# Altium footprint library PCB24.PcbLib: 86 footprints (part 3 of 6)
Each footprint in its own frame and in the unit in brackets; x right, y up, seen from the top. Pads: shape width x height; smd on the part's side, far side on the other; paste and mask are expansions set on the pad; w line width, h text height; cw(c..) or ccw(c..) is an arc to the next point about the centre after c.
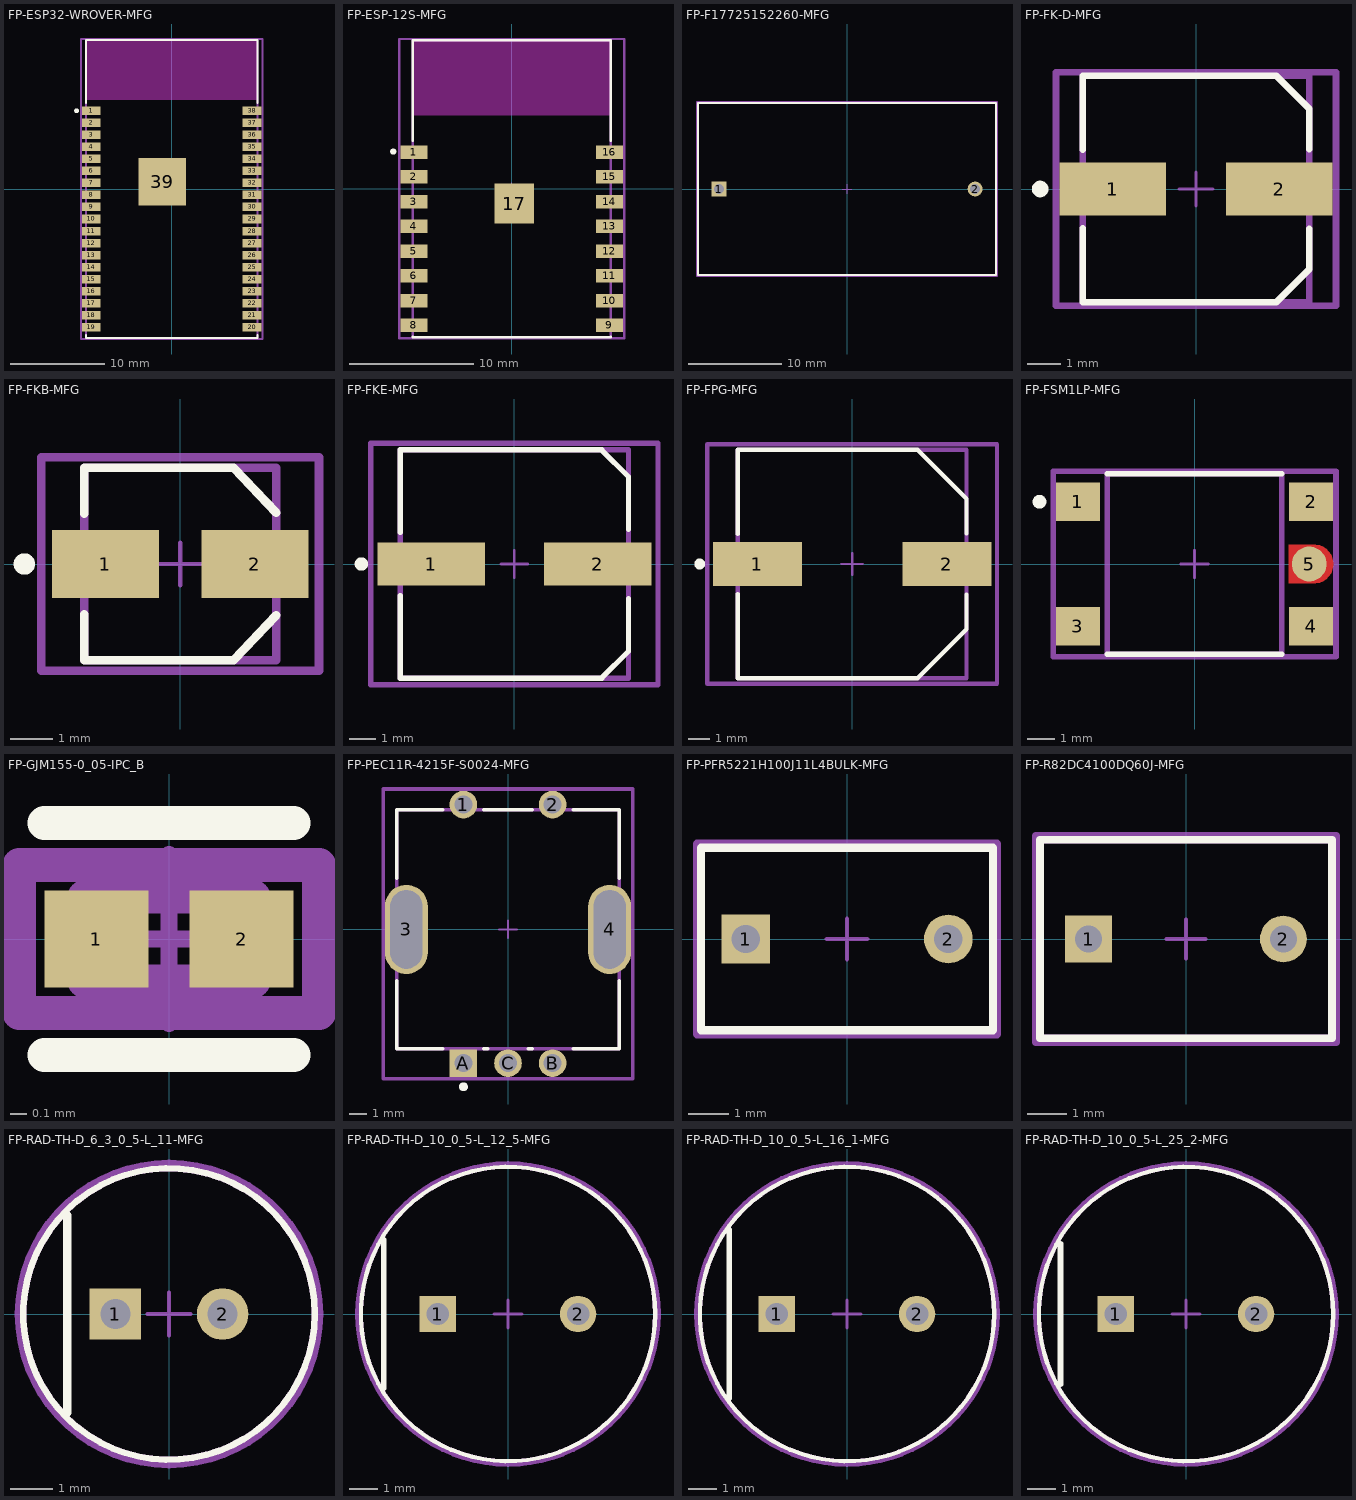
[diagram p2: the footprints below, top view; thin cyan lines are the x and y axes]

## FP-ESP32-WROVER-MFG [mm]
pads (39):
  rect 2x0.9 smd paste+0 mask+0: 1(-8.5,8.26) 2(-8.5,6.99) 3(-8.5,5.72) 4(-8.5,4.45) 5(-8.5,3.18) 6(-8.5,1.91) 7(-8.5,0.64) 8(-8.5,-0.63) 9(-8.5,-1.9) 10(-8.5,-3.17) 11(-8.5,-4.44) 12(-8.5,-5.71) 13(-8.5,-6.98) 14(-8.5,-8.25) 15(-8.5,-9.52) 16(-8.5,-10.79) 17(-8.5,-12.06) 18(-8.5,-13.33) 19(-8.5,-14.6) 20(8.5,-14.6) 21(8.5,-13.33) 22(8.5,-12.06) 23(8.5,-10.79) 24(8.5,-9.52) 25(8.5,-8.25) 26(8.5,-6.98) 27(8.5,-5.71) 28(8.5,-4.44) 29(8.5,-3.17) 30(8.5,-1.9) 31(8.5,-0.63) 32(8.5,0.64) 33(8.5,1.91) 34(8.5,3.18) 35(8.5,4.45) 36(8.5,5.72) 37(8.5,6.99) 38(8.5,8.26)
  rect 5x5 smd paste+0 mask+0: 39(-1,0.76)
Top Overlay:
  circle w0.25: c-10.05,8.26 r0.125
  lines w0.2: -9.05,-15.425 -9.05,-15.75 9.05,-15.75 9.05,-15.425 ; -9.05,9.085 -9.05,15.75 9.05,15.75 9.05,9.085
Keep-Out Layer:
  rectangle: -9,9.4 9,15.7
Top 3D Body:
  lines w0.2: -9.05,-15.75 9.05,-15.75 9.05,15.75 -9.05,15.75 -9.05,-15.75
Top Courtyard:
  lines w0.2: -9.6,-15.85 9.6,-15.85 9.6,15.85 -9.6,15.85 -9.6,-15.85
Top Assembly:
  lines w0.2: -9.6,-15.85 9.6,-15.85 9.6,15.85 -9.6,15.85 -9.6,-15.85
  text ".Designator" at 0,0 h1
Top Component Center:
  lines w0.1: -0.5,0 0.5,0 ; 0,-0.5 0,0.5
3D body "UNK_Espressif_Systems_ESP32-WROVER_eec.STEP": height 0.25, standoff 0, extent -9.6,-15.85 9.6,15.85

## FP-ESP-12S-MFG [mm]
pads (17):
  rect 2.2x1.1 smd paste+0 mask+0: 1(-7.9,2.95) 2(-7.9,0.95) 3(-7.9,-1.05) 4(-7.9,-3.05) 5(-7.9,-5.05) 6(-7.9,-7.05) 7(-7.9,-9.05) 8(-7.9,-11.05) 9(7.9,-11.05) 10(7.9,-9.05) 11(7.9,-7.05) 12(7.9,-5.05) 13(7.9,-3.05) 14(7.9,-1.05) 15(7.9,0.95) 16(7.9,2.95)
  rect 3.2x3.2 smd paste+0 mask+0: 17(0.2,-1.2)
Top Overlay:
  circle w0.25: c-9.575,3 r0.125
  lines w0.2: -8,-11.975 -8,-12 8,-12 8,-11.975 ; -8,3.875 -8,12 8,12 8,3.875
Keep-Out Layer:
  rectangle: -8,5.9 8,12
  rectangle: -8,5.9 8,12
Top 3D Body:
  lines w0.2: -8,-12 8,-12 8,12 -8,12 -8,-12
Top Courtyard:
  lines w0.2: -9.1,-12.1 9.1,-12.1 9.1,12.1 -9.1,12.1 -9.1,-12.1
Top Assembly:
  lines w0.2: -9.1,-12.1 9.1,-12.1 9.1,12.1 -9.1,12.1 -9.1,-12.1
  text ".Designator" at 0,0.188 h1
Top Component Center:
  lines w0.1: -0.5,0 0.5,0 ; 0,-0.5 0,0.5
3D body "UNK_RF_Solutions_ESP-12S_eec.STEP": height 0.25, standoff 0, extent -9.1,-12.1 9.1,12.1

## FP-F17725152260-MFG [mm]
pads (2):
  rect 1.6x1.6 hole 1.05 paste+0 mask+0: 1(-13.75,0)
  round 1.6 hole 1.05 paste+0 mask+0: 2(13.75,0)
Top Overlay:
  lines w0.2: -16,-9.25 16,-9.25 16,9.25 -16,9.25 -16,-9.25
Top 3D Body:
  lines w0.2: -16,-9.25 16,-9.25 16,9.25 -16,9.25 -16,-9.25
Top Courtyard:
  lines w0.2: -16.1,-9.35 16.1,-9.35 16.1,9.35 -16.1,9.35 -16.1,-9.35
Top Assembly:
  lines w0.2: -16.1,-9.35 16.1,-9.35 16.1,9.35 -16.1,9.35 -16.1,-9.35
  text ".Designator" at 0,0 h1
Top Component Center:
  lines w0.1: -0.5,0 0.5,0 ; 0,-0.5 0,0.5
3D body "Cap_Vishay_F17725152260_eec.STEP": height 0.25, standoff 0, extent -16.1,-9.35 16.1,9.35

## FP-FK-D-MFG [mm]
pads (2):
  rect 3.2x1.6 smd paste+0 mask+0: 1(-2.5,0) 2(2.5,0)
Top Overlay:
  circle w0.25: c-4.675,0 r0.125
  lines w0.2: -3.4,-1.175 -3.4,-3.4 2.4,-3.4 3.4,-2.4 3.4,-1.2 ; -3.4,1.175 -3.4,3.4 2.4,3.4 3.4,2.4 3.4,1.2
Top 3D Body:
  lines w0.2: -3.4,-3.4 3.4,-3.4 3.4,3.4 -3.4,3.4 -3.4,-3.4
Top Courtyard:
  lines w0.2: -4.2,-3.5 4.2,-3.5 4.2,3.5 -4.2,3.5 -4.2,-3.5
Top Assembly:
  lines w0.2: -4.2,-3.5 4.2,-3.5 4.2,3.5 -4.2,3.5 -4.2,-3.5
  text ".Designator" at 0,0.188 h1
Top Component Center:
  lines w0.1: -0.5,0 0.5,0 ; 0,-0.5 0,0.5
3D body "Cap_Panasonic_EEE-FK1V470P_eec.STEP": height 0.25, standoff 0, extent -4.2,-3.5 4.2,3.5

## FP-FKB-MFG [mm]
pads (2):
  rect 2.5x1.6 smd paste+0 mask+0: 1(-1.75,0) 2(1.75,0)
Top Overlay:
  circle w0.25: c-3.65,0 r0.125
  lines w0.2: -2.25,-1.175 -2.25,-2.25 1.25,-2.25 2.25,-1.2 ; -2.25,1.175 -2.25,2.25 1.25,2.25 2.25,1.2
Top 3D Body:
  lines w0.2: -2.25,-2.25 2.25,-2.25 2.25,2.25 -2.25,2.25 -2.25,-2.25
Top Courtyard:
  lines w0.2: -3.25,-2.5 3.25,-2.5 3.25,2.5 -3.25,2.5 -3.25,-2.5
Top Assembly:
  lines w0.2: -3.25,-2.5 3.25,-2.5 3.25,2.5 -3.25,2.5 -3.25,-2.5
  text ".Designator" at 0,0.188 h1
Top Component Center:
  lines w0.1: -0.5,0 0.5,0 ; 0,-0.5 0,0.5
3D body "Cap_Panasonic_EEEFK1E100R_eec.STEP": height 0.25, standoff 0, extent -3.25,-2.5 3.25,2.5

## FP-FKE-MFG [mm]
pads (2):
  rect 4x1.6 smd paste+0 mask+0: 1(-3.1,0) 2(3.1,0)
Top Overlay:
  circle w0.25: c-5.7,0 r0.125
  lines w0.2: -4.25,-1.175 -4.25,-4.25 3.25,-4.25 4.25,-3.25 4.25,-1.3 ; -4.25,1.175 -4.25,4.25 3.25,4.25 4.25,3.25 4.25,1.3
Top 3D Body:
  lines w0.2: -4.25,-4.25 4.25,-4.25 4.25,4.25 -4.25,4.25 -4.25,-4.25
Top Courtyard:
  lines w0.2: -5.35,-4.5 5.35,-4.5 5.35,4.5 -5.35,4.5 -5.35,-4.5
Top Assembly:
  lines w0.2: -5.35,-4.5 5.35,-4.5 5.35,4.5 -5.35,4.5 -5.35,-4.5
  text ".Designator" at 0,0.188 h1
Top Component Center:
  lines w0.1: -0.5,0 0.5,0 ; 0,-0.5 0,0.5
3D body "Cap_Panasonic_EEEFK1E101P_eec.STEP": height 0.25, standoff 0, extent -5.35,-4.5 5.35,4.5

## FP-FPG-MFG [mm]
pads (2):
  rect 4.1x2 smd paste+0 mask+0: 1(-4.35,0) 2(4.35,0)
Top Overlay:
  circle w0.25: c-7,0 r0.125
  lines w0.2: -5.25,-1.375 -5.25,-5.25 3,-5.25 5.25,-3 5.25,-1.4 ; -5.25,1.375 -5.25,5.25 3,5.25 5.25,3 5.25,1.4
Top 3D Body:
  lines w0.2: -5.25,-5.25 5.25,-5.25 5.25,5.25 -5.25,5.25 -5.25,-5.25
Top Courtyard:
  lines w0.2: -6.65,-5.5 6.65,-5.5 6.65,5.5 -6.65,5.5 -6.65,-5.5
Top Assembly:
  lines w0.2: -6.65,-5.5 6.65,-5.5 6.65,5.5 -6.65,5.5 -6.65,-5.5
  text ".Designator" at 0,0.188 h1
Top Component Center:
  lines w0.1: -0.5,0 0.5,0 ; 0,-0.5 0,0.5
3D body "Cap_Panasonic_EEEFP1V331AP_eec.STEP": height 0.25, standoff 0, extent -6.65,-5.5 6.65,5.5

## FP-FSM1LP-MFG [mm]
pads (5):
  rect 1.6x1.395 smd paste+0 mask+0: 1(-4.205,2.248) 2(4.205,2.248) 3(-4.205,-2.248) 4(4.205,-2.248)
  round 1.26 smd paste+0 mask+0: 5(4.139,0)
Top Layer:
  region: 3.405,0.7 4.307,0.7 4.376,0.7 4.511,0.673 4.638,0.621 4.752,0.544 4.849,0.447 4.926,0.333 4.978,0.206 5.005,0.071 5.005,0.002 5.005,-0.002 5.005,-0.071 4.978,-0.206 4.926,-0.333 4.849,-0.447 4.752,-0.544 4.638,-0.621 4.511,-0.673 4.376,-0.7 4.307,-0.7 3.405,-0.7
Top Overlay:
  circle w0.25: c-5.595,2.245 r0.125
  lines w0.2: -3.145,-3.25 3.145,-3.25 ; -3.145,3.25 3.145,3.25
Top 3D Body:
  lines w0.2: -3.145,-3.25 3.145,-3.25 3.145,3.25 -3.145,3.25 -3.145,-3.25
Top Courtyard:
  lines w0.2: -5.105,-3.35 5.105,-3.35 5.105,3.35 -5.105,3.35 -5.105,-3.35
Top Assembly:
  lines w0.2: -5.105,-3.35 5.105,-3.35 5.105,3.35 -5.105,3.35 -5.105,-3.35
  text ".Designator" at 0,0.188 h1
Top Component Center:
  lines w0.1: -0.5,0 0.5,0 ; 0,-0.5 0,0.5
3D body "Switch_TE_Connectivity_FSM1LP_eec.STEP": height 0.25, standoff 0, extent -5.105,-3.35 5.105,3.35

## FP-GJM155-0_05-IPC_B [mm]
pads (2):
  rect 0.615x0.572 smd paste+0 mask+0: 1(-0.429,0) 2(0.429,0)
Top Overlay:
  lines w0.2: -0.736,-0.686 0.736,-0.686 ; -0.736,0.686 0.736,0.686
Top 3D Body:
  lines w0.2: -0.5,-0.25 0.5,-0.25 0.5,0.25 -0.5,0.25 -0.5,-0.25
Top Courtyard:
  lines w0.2: -0.886,-0.436 0.886,-0.436 0.886,0.436 -0.886,0.436 -0.886,-0.436
Top Assembly:
  lines w0.2: -0.886,-0.436 0.886,-0.436 0.886,0.436 -0.886,0.436 -0.886,-0.436
  text ".Designator" at 0,0.188 h1
Top Component Center:
  lines w0.1: -0.5,0 0.5,0 ; 0,-0.5 0,0.5
3D body "Cap_Murata_GJM1551C1H7R0DB01D_eec.STEP": height 0.25, standoff 0, extent -0.886,-0.436 0.886,0.436

## FP-PEC11R-4215F-S0024-MFG [mm]
pads (7):
  round 1.55 hole 1 paste+0 mask+0: 1(-2.5,7) 2(2.5,7) B(2.5,-7.5) C(0,-7.5)
  rrect100% 2.4x5 hole 4.4 slot 1.8 at 0 deg paste+0 mask+0: 3(-5.7,0) 4(5.7,0)
  rect 1.55x1.55 hole 1 paste+0 mask+0: A(-2.5,-7.5)
Top Overlay:
  circle w0.25: c-2.5,-8.825 r0.125
  lines w0.2: -6.25,-2.875 -6.25,-6.7 -3.65,-6.7 ; -6.25,2.875 -6.25,6.7 -3.65,6.7 ; -1.35,-6.7 -1.15,-6.7 ; -1.35,6.7 1.35,6.7 ; 1.15,-6.7 1.35,-6.7 ; 3.65,-6.7 6.25,-6.7 6.25,-2.875 ; 3.65,6.7 6.25,6.7 6.25,2.875
Top 3D Body:
  lines w0.2: -6.25,-6.7 6.25,-6.7 6.25,6.7 -6.25,6.7 -6.25,-6.7
Top Courtyard:
  lines w0.2: -7,-8.375 7,-8.375 7,7.875 -7,7.875 -7,-8.375
Top Assembly:
  lines w0.2: -7,-8.375 7,-8.375 7,7.875 -7,7.875 -7,-8.375
  text ".Designator" at 0,-0.062 h1
Top Component Center:
  lines w0.1: -0.5,0 0.5,0 ; 0,-0.5 0,0.5
3D body "Enc_Bourns_PEC11R-4215F-S0024_eec.STEP": height 0.25, standoff 0, extent -7,-8.375 7,7.875

## FP-PFR5221H100J11L4BULK-MFG [mm]
pads (2):
  rect 1.2x1.2 hole 0.7 paste+0 mask+0: 1(-2.5,0)
  round 1.2 hole 0.7 paste+0 mask+0: 2(2.5,0)
Top Overlay:
  lines w0.2: -3.6,-2.25 3.6,-2.25 3.6,2.25 -3.6,2.25 -3.6,-2.25
Top 3D Body:
  lines w0.2: -3.6,-2.25 3.6,-2.25 3.6,2.25 -3.6,2.25 -3.6,-2.25
Top Courtyard:
  lines w0.2: -3.7,-2.35 3.7,-2.35 3.7,2.35 -3.7,2.35 -3.7,-2.35
Top Assembly:
  lines w0.2: -3.7,-2.35 3.7,-2.35 3.7,2.35 -3.7,2.35 -3.7,-2.35
  text ".Designator" at 0,0 h1
Top Component Center:
  lines w0.1: -0.5,0 0.5,0 ; 0,-0.5 0,0.5
3D body "Cap_Kemet_PFR5221H100J11L4BULK_eec.STEP": height 0.25, standoff 0, extent -3.7,-2.35 3.7,2.35

## FP-R82DC4100DQ60J-MFG [mm]
pads (2):
  rect 1.2x1.2 hole 0.7 paste+0 mask+0: 1(-2.5,0)
  round 1.2 hole 0.7 paste+0 mask+0: 2(2.5,0)
Top Overlay:
  lines w0.2: -3.75,-2.55 3.75,-2.55 3.75,2.55 -3.75,2.55 -3.75,-2.55
Top 3D Body:
  lines w0.2: -3.75,-2.55 3.75,-2.55 3.75,2.55 -3.75,2.55 -3.75,-2.55
Top Courtyard:
  lines w0.2: -3.85,-2.65 3.85,-2.65 3.85,2.65 -3.85,2.65 -3.85,-2.65
Top Assembly:
  lines w0.2: -3.85,-2.65 3.85,-2.65 3.85,2.65 -3.85,2.65 -3.85,-2.65
  text ".Designator" at 0,0 h1
Top Component Center:
  lines w0.1: -0.5,0 0.5,0 ; 0,-0.5 0,0.5
3D body "Cap_Kemet_R82DC4100DQ60J_eec.STEP": height 0.25, standoff 0, extent -3.85,-2.65 3.85,2.65

## FP-RAD-TH-D_6_3_0_5-L_11-MFG [mm]
pads (2):
  rect 1.2x1.2 hole 0.7 paste+0 mask+0: 1(-1.25,0)
  round 1.2 hole 0.7 paste+0 mask+0: 2(1.25,0)
Top Overlay:
  circle w0.15: c0,0 r3.4
  lines w0.2: -2.375,-2.3 -2.375,2.3
Top 3D Body:
  circle w0.15: c0,0 r3.4
Top Courtyard:
  lines w0.2: -3.5,0 cw(c0,0) 3.5,0 cw(c0,0) -3.5,0
Top Assembly:
  text ".Designator" at 0,0.188 h1
Top Component Center:
  lines w0.1: -0.5,0 0.5,0 ; 0,-0.5 0,0.5
3D body "Cap_Panasonic_EEUFC1H330_eec.STEP": height 0.25, standoff 0, extent -3.5,-3.5 3.5,3.5

## FP-RAD-TH-D_10_0_5-L_12_5-MFG [mm]
pads (2):
  rect 1.3x1.3 hole 0.8 paste+0 mask+0: 1(-2.5,0)
  round 1.3 hole 0.8 paste+0 mask+0: 2(2.5,0)
Top Overlay:
  circle w0.15: c0,0 r5.25
  lines w0.2: -4.425,-2.65 -4.425,2.65
Top 3D Body:
  circle w0.15: c0,0 r5.25
Top Courtyard:
  lines w0.2: -5.35,0 cw(c0,0) 5.35,0 cw(c0,0) -5.35,0
Top Assembly:
  text ".Designator" at 0,0.188 h1
Top Component Center:
  lines w0.1: -0.5,0 0.5,0 ; 0,-0.5 0,0.5
3D body "Cap_Panasonic_EEUTA1H101_eec.STEP": height 0.25, standoff 0, extent -5.35,-5.35 5.35,5.35

## FP-RAD-TH-D_10_0_5-L_16_1-MFG [mm]
pads (2):
  rect 1.3x1.3 hole 0.8 paste+0 mask+0: 1(-2.5,0)
  round 1.3 hole 0.8 paste+0 mask+0: 2(2.5,0)
Top Overlay:
  circle w0.15: c0,0 r5.25
  lines w0.2: -4.2,-3 -4.2,3
Top 3D Body:
  circle w0.15: c0,0 r5.25
Top Courtyard:
  lines w0.2: -5.35,0 cw(c0,0) 5.35,0 cw(c0,0) -5.35,0
Top Assembly:
  text ".Designator" at 0,0.188 h1
Top Component Center:
  lines w0.1: -0.5,0 0.5,0 ; 0,-0.5 0,0.5
3D body "Cap_Panasonic_EEUTA1J470_eec.STEP": height 0.25, standoff 0, extent -5.35,-5.35 5.35,5.35

## FP-RAD-TH-D_10_0_5-L_25_2-MFG [mm]
pads (2):
  rect 1.3x1.3 hole 0.8 paste+0 mask+0: 1(-2.5,0)
  round 1.3 hole 0.8 paste+0 mask+0: 2(2.5,0)
Top Overlay:
  circle w0.15: c0,0 r5.25
  lines w0.2: -4.475,-2.5 -4.475,2.5
Top 3D Body:
  circle w0.15: c0,0 r5.25
Top Courtyard:
  lines w0.2: -5.35,0 cw(c0,0) 5.35,0 cw(c0,0) -5.35,0
Top Assembly:
  text ".Designator" at 0,0.188 h1
Top Component Center:
  lines w0.1: -0.5,0 0.5,0 ; 0,-0.5 0,0.5
3D body "Cap_Panasonic_EEUFC0J182E_eec.STEP": height 0.25, standoff 0, extent -5.35,-5.35 5.35,5.35